# Altium schematic symbol library jlcpcb_2025_04_resistors_extended_1210.schlib: 2670 symbols (part 12 of 14) (continued)
## RS-1210K4701FT (continued)
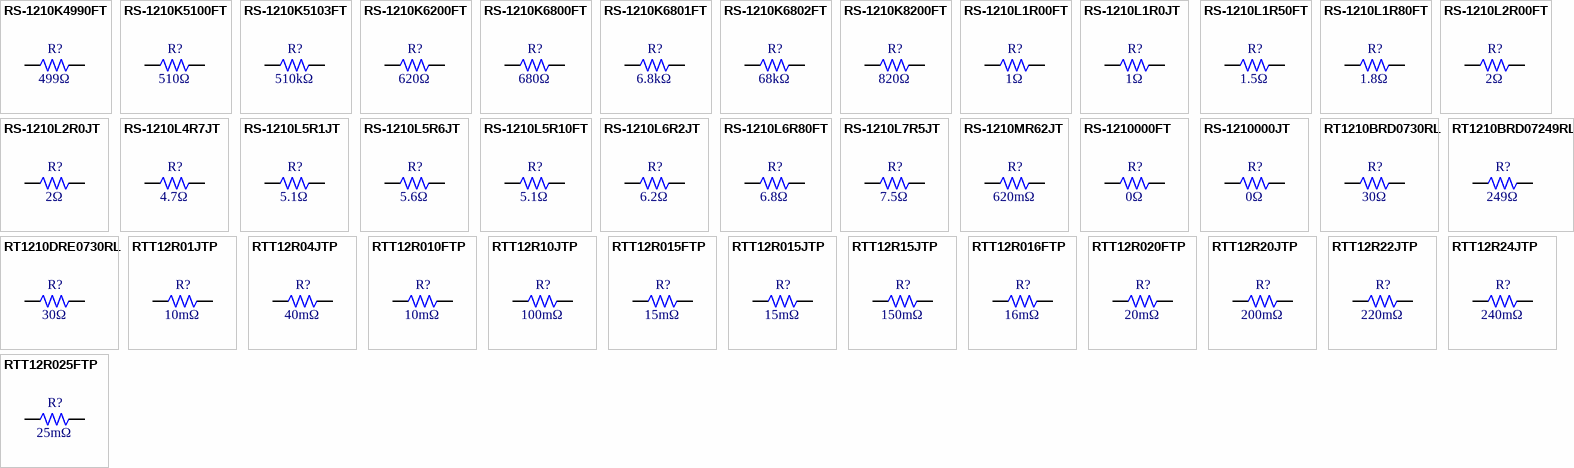
[diagram p56: symbols RS-1210K4990FT to RTT12R025FTP]

## RS-1210K4990FT
designator R?  Resistance: 499Ω  (hidden comment: *)
Resistor, 499Ω, ±1%, 333.333mW, 200V, ±100ppm/℃, -55℃~+155℃, SMD 1210; Manufacturer: Uniroyal; Manufacturer Part Number: RS-1210K4990FT; Supplier 1: LCSC; Supplier Part Number 1: C341622; JLCPCB Part Number: C341622; Power Rating: 333.333mW; Category: Resistors; Package Size: 1210; JLCPCB Basic Part: Yes; Tolerance: ±1%; Voltage Rating: 200V; Temperature Coefficient: ±100ppm/℃; Temperature Rating: -55℃~+155℃; ComponentLink1Description: Datasheet; ComponentLink1URL: https://wmsc.lcsc.com/wmsc/upload/file/pdf/v2/lcsc/2304140030_FH--Guangdong-Fenghua-Advanced-Tech-RS-1210K4990FT_C341622.pdf; ComponentLink2Description: JLCPCB Part URL; ComponentLink2URL: https://jlcpcb.com/partdetail/C341622
pins: 1, 2
1 alternate drawing of the same symbol

## RS-1210K5100FT
designator R?  Resistance: 510Ω  (hidden comment: *)
Resistor, 510Ω, ±1%, 333.333mW, 200V, ±100ppm/℃, -55℃~+155℃, SMD 1210; Manufacturer: Uniroyal; Manufacturer Part Number: RS-1210K5100FT; Supplier 1: LCSC; Supplier Part Number 1: C2991539; JLCPCB Part Number: C2991539; Power Rating: 333.333mW; Category: Resistors; Package Size: 1210; JLCPCB Basic Part: Yes; Tolerance: ±1%; Voltage Rating: 200V; Temperature Coefficient: ±100ppm/℃; Temperature Rating: -55℃~+155℃; ComponentLink1Description: Datasheet; ComponentLink1URL: https://wmsc.lcsc.com/wmsc/upload/file/pdf/v2/lcsc/2204111630_FH--Guangdong-Fenghua-Advanced-Tech-RS-1210K5100FT_C2991539.pdf; ComponentLink2Description: JLCPCB Part URL; ComponentLink2URL: https://jlcpcb.com/partdetail/C2991539
pins: 1, 2
1 alternate drawing of the same symbol

## RS-1210K5103FT
designator R?  Resistance: 510kΩ  (hidden comment: *)
Resistor, 510kΩ, ±1%, 333.333mW, ±100ppm/℃, -55℃~+155℃, SMD 1210; Manufacturer: Uniroyal; Manufacturer Part Number: RS-1210K5103FT; Supplier 1: LCSC; Supplier Part Number 1: C2939812; JLCPCB Part Number: C2939812; Power Rating: 333.333mW; Category: Resistors; Package Size: 1210; JLCPCB Basic Part: Yes; Tolerance: ±1%; Temperature Coefficient: ±100ppm/℃; Temperature Rating: -55℃~+155℃; ComponentLink1Description: Datasheet; ComponentLink1URL: https://wmsc.lcsc.com/wmsc/upload/file/pdf/v2/lcsc/2201121830_FH--Guangdong-Fenghua-Advanced-Tech-RS-1210K5103FT_C2939812.pdf; ComponentLink2Description: JLCPCB Part URL; ComponentLink2URL: https://jlcpcb.com/partdetail/C2939812
pins: 1, 2
1 alternate drawing of the same symbol

## RS-1210K6200FT
designator R?  Resistance: 620Ω  (hidden comment: *)
Resistor, 620Ω, ±1%, 333.333mW, ±100ppm/℃, -55℃~+155℃, SMD 1210; Manufacturer: Uniroyal; Manufacturer Part Number: RS-1210K6200FT; Supplier 1: LCSC; Supplier Part Number 1: C2961544; JLCPCB Part Number: C2961544; Power Rating: 333.333mW; Category: Resistors; Package Size: 1210; JLCPCB Basic Part: Yes; Tolerance: ±1%; Temperature Coefficient: ±100ppm/℃; Temperature Rating: -55℃~+155℃; ComponentLink1Description: Datasheet; ComponentLink1URL: https://wmsc.lcsc.com/wmsc/upload/file/pdf/v2/lcsc/2202211530_FH--Guangdong-Fenghua-Advanced-Tech-RS-1210K6200FT_C2961544.pdf; ComponentLink2Description: JLCPCB Part URL; ComponentLink2URL: https://jlcpcb.com/partdetail/C2961544
pins: 1, 2
1 alternate drawing of the same symbol

## RS-1210K6800FT
designator R?  Resistance: 680Ω  (hidden comment: *)
Resistor, 680Ω, ±1%, 333.333mW, 200V, ±100ppm/℃, -55℃~+155℃, SMD 1210; Manufacturer: Uniroyal; Manufacturer Part Number: RS-1210K6800FT; Supplier 1: LCSC; Supplier Part Number 1: C2991549; JLCPCB Part Number: C2991549; Power Rating: 333.333mW; Category: Resistors; Package Size: 1210; JLCPCB Basic Part: Yes; Tolerance: ±1%; Voltage Rating: 200V; Temperature Coefficient: ±100ppm/℃; Temperature Rating: -55℃~+155℃; ComponentLink1Description: Datasheet; ComponentLink1URL: https://wmsc.lcsc.com/wmsc/upload/file/pdf/v2/lcsc/2204111630_FH--Guangdong-Fenghua-Advanced-Tech-RS-1210K6800FT_C2991549.pdf; ComponentLink2Description: JLCPCB Part URL; ComponentLink2URL: https://jlcpcb.com/partdetail/C2991549
pins: 1, 2
1 alternate drawing of the same symbol

## RS-1210K6801FT
designator R?  Resistance: 6.8kΩ  (hidden comment: *)
Resistor, 6.8kΩ, ±1%, 333.333mW, 200V, ±100ppm/℃, -55℃~+155℃, SMD 1210; Manufacturer: Uniroyal; Manufacturer Part Number: RS-1210K6801FT; Supplier 1: LCSC; Supplier Part Number 1: C310374; JLCPCB Part Number: C310374; Power Rating: 333.333mW; Category: Resistors; Package Size: 1210; JLCPCB Basic Part: Yes; Tolerance: ±1%; Voltage Rating: 200V; Temperature Coefficient: ±100ppm/℃; Temperature Rating: -55℃~+155℃; ComponentLink1Description: Datasheet; ComponentLink1URL: https://wmsc.lcsc.com/wmsc/upload/file/pdf/v2/lcsc/2304140030_FH--Guangdong-Fenghua-Advanced-Tech-RS-1210K6801FT_C310374.pdf; ComponentLink2Description: JLCPCB Part URL; ComponentLink2URL: https://jlcpcb.com/partdetail/C310374
pins: 1, 2
1 alternate drawing of the same symbol

## RS-1210K6802FT
designator R?  Resistance: 68kΩ  (hidden comment: *)
Resistor, 68kΩ, ±1%, 333.333mW, ±100ppm/℃, SMD 1210; Manufacturer: Uniroyal; Manufacturer Part Number: RS-1210K6802FT; Supplier 1: LCSC; Supplier Part Number 1: C880420; JLCPCB Part Number: C880420; Power Rating: 333.333mW; Category: Resistors; Package Size: 1210; JLCPCB Basic Part: Yes; Tolerance: ±1%; Temperature Coefficient: ±100ppm/℃; ComponentLink1Description: Datasheet; ComponentLink1URL: https://wmsc.lcsc.com/wmsc/upload/file/pdf/v2/lcsc/2304140030_FH--Guangdong-Fenghua-Advanced-Tech-RS-1210K6802FT_C880420.pdf; ComponentLink2Description: JLCPCB Part URL; ComponentLink2URL: https://jlcpcb.com/partdetail/C880420
pins: 1, 2
1 alternate drawing of the same symbol

## RS-1210K8200FT
designator R?  Resistance: 820Ω  (hidden comment: *)
Resistor, 820Ω, ±1%, 333.333mW, ±100ppm/℃, SMD 1210; Manufacturer: Uniroyal; Manufacturer Part Number: RS-1210K8200FT; Supplier 1: LCSC; Supplier Part Number 1: C880401; JLCPCB Part Number: C880401; Power Rating: 333.333mW; Category: Resistors; Package Size: 1210; JLCPCB Basic Part: Yes; Tolerance: ±1%; Temperature Coefficient: ±100ppm/℃; ComponentLink1Description: Datasheet; ComponentLink1URL: https://wmsc.lcsc.com/wmsc/upload/file/pdf/v2/lcsc/2304140030_FH--Guangdong-Fenghua-Advanced-Tech-RS-1210K8200FT_C880401.pdf; ComponentLink2Description: JLCPCB Part URL; ComponentLink2URL: https://jlcpcb.com/partdetail/C880401
pins: 1, 2
1 alternate drawing of the same symbol

## RS-1210L1R00FT
designator R?  Resistance: 1Ω  (hidden comment: *)
Resistor, 1Ω, ±1%, 333.333mW, ±250ppm/℃, -55℃~+155℃, SMD 1210; Manufacturer: Uniroyal; Manufacturer Part Number: RS-1210L1R00FT; Supplier 1: LCSC; Supplier Part Number 1: C2961549; JLCPCB Part Number: C2961549; Power Rating: 333.333mW; Category: Resistors; Package Size: 1210; JLCPCB Basic Part: Yes; Tolerance: ±1%; Temperature Coefficient: ±250ppm/℃; Temperature Rating: -55℃~+155℃; ComponentLink1Description: Datasheet; ComponentLink1URL: https://wmsc.lcsc.com/wmsc/upload/file/pdf/v2/lcsc/2202211530_FH--Guangdong-Fenghua-Advanced-Tech-RS-1210L1R00FT_C2961549.pdf; ComponentLink2Description: JLCPCB Part URL; ComponentLink2URL: https://jlcpcb.com/partdetail/C2961549
pins: 1, 2
1 alternate drawing of the same symbol

## RS-1210L1R0JT
designator R?  Resistance: 1Ω  (hidden comment: *)
Resistor, 1Ω, ±5%, 333.333mW, 200V, ±250ppm/℃, -55℃~+155℃, SMD 1210; Manufacturer: Uniroyal; Manufacturer Part Number: RS-1210L1R0JT; Supplier 1: LCSC; Supplier Part Number 1: C294809; JLCPCB Part Number: C294809; Power Rating: 333.333mW; Category: Resistors; Package Size: 1210; JLCPCB Basic Part: Yes; Tolerance: ±5%; Voltage Rating: 200V; Temperature Coefficient: ±250ppm/℃; Temperature Rating: -55℃~+155℃; ComponentLink1Description: Datasheet; ComponentLink1URL: https://wmsc.lcsc.com/wmsc/upload/file/pdf/v2/lcsc/2304140030_FH--Guangdong-Fenghua-Advanced-Tech-RS-1210L1R0JT_C294809.pdf; ComponentLink2Description: JLCPCB Part URL; ComponentLink2URL: https://jlcpcb.com/partdetail/C294809
pins: 1, 2
1 alternate drawing of the same symbol

## RS-1210L1R50FT
designator R?  Resistance: 1.5Ω  (hidden comment: *)
Resistor, 1.5Ω, ±1%, 333.333mW, 200V, ±250ppm/℃, -55℃~+155℃, SMD 1210; Manufacturer: Uniroyal; Manufacturer Part Number: RS-1210L1R50FT; Supplier 1: LCSC; Supplier Part Number 1: C341614; JLCPCB Part Number: C341614; Power Rating: 333.333mW; Category: Resistors; Package Size: 1210; JLCPCB Basic Part: Yes; Tolerance: ±1%; Voltage Rating: 200V; Temperature Coefficient: ±250ppm/℃; Temperature Rating: -55℃~+155℃; ComponentLink1Description: Datasheet; ComponentLink1URL: https://wmsc.lcsc.com/wmsc/upload/file/pdf/v2/lcsc/2304140030_FH--Guangdong-Fenghua-Advanced-Tech-RS-1210L1R50FT_C341614.pdf; ComponentLink2Description: JLCPCB Part URL; ComponentLink2URL: https://jlcpcb.com/partdetail/C341614
pins: 1, 2
1 alternate drawing of the same symbol

## RS-1210L1R80FT
designator R?  Resistance: 1.8Ω  (hidden comment: *)
Resistor, 1.8Ω, ±1%, 333.333mW, 200V, ±250ppm/℃, -55℃~+155℃, SMD 1210; Manufacturer: Uniroyal; Manufacturer Part Number: RS-1210L1R80FT; Supplier 1: LCSC; Supplier Part Number 1: C341615; JLCPCB Part Number: C341615; Power Rating: 333.333mW; Category: Resistors; Package Size: 1210; JLCPCB Basic Part: Yes; Tolerance: ±1%; Voltage Rating: 200V; Temperature Coefficient: ±250ppm/℃; Temperature Rating: -55℃~+155℃; ComponentLink1Description: Datasheet; ComponentLink1URL: https://wmsc.lcsc.com/wmsc/upload/file/pdf/v2/lcsc/2304140030_FH--Guangdong-Fenghua-Advanced-Tech-RS-1210L1R80FT_C341615.pdf; ComponentLink2Description: JLCPCB Part URL; ComponentLink2URL: https://jlcpcb.com/partdetail/C341615
pins: 1, 2
1 alternate drawing of the same symbol

## RS-1210L2R00FT
designator R?  Resistance: 2Ω  (hidden comment: *)
Resistor, 2Ω, ±1%, ±250ppm/℃, SMD 1210; Manufacturer: Uniroyal; Manufacturer Part Number: RS-1210L2R00FT; Supplier 1: LCSC; Supplier Part Number 1: C3036932; JLCPCB Part Number: C3036932; Category: Resistors; Package Size: 1210; JLCPCB Basic Part: Yes; Tolerance: ±1%; Temperature Coefficient: ±250ppm/℃; ComponentLink1Description: Datasheet; ComponentLink1URL: https://wmsc.lcsc.com/wmsc/upload/file/pdf/v2/lcsc/2206291630_FH--Guangdong-Fenghua-Advanced-Tech-RS-1210L2R00FT_C3036932.pdf; ComponentLink2Description: JLCPCB Part URL; ComponentLink2URL: https://jlcpcb.com/partdetail/C3036932
pins: 1, 2
1 alternate drawing of the same symbol

## RS-1210L2R0JT
designator R?  Resistance: 2Ω  (hidden comment: *)
Resistor, 2Ω, ±5%, 333.333mW, 200V, ±250ppm/℃, -55℃~+155℃, SMD 1210; Manufacturer: Uniroyal; Manufacturer Part Number: RS-1210L2R0JT; Supplier 1: LCSC; Supplier Part Number 1: C2842075; JLCPCB Part Number: C2842075; Power Rating: 333.333mW; Category: Resistors; Package Size: 1210; JLCPCB Basic Part: Yes; Tolerance: ±5%; Voltage Rating: 200V; Temperature Coefficient: ±250ppm/℃; Temperature Rating: -55℃~+155℃; ComponentLink1Description: Datasheet; ComponentLink1URL: https://wmsc.lcsc.com/wmsc/upload/file/pdf/v2/lcsc/2108071830_FH--Guangdong-Fenghua-Advanced-Tech-RS-1210L2R0JT_C2842075.pdf; ComponentLink2Description: JLCPCB Part URL; ComponentLink2URL: https://jlcpcb.com/partdetail/C2842075
pins: 1, 2
1 alternate drawing of the same symbol

## RS-1210L4R7JT
designator R?  Resistance: 4.7Ω  (hidden comment: *)
Resistor, 4.7Ω, ±5%, 333.333mW, 200V, ±250ppm/℃, -55℃~+155℃, SMD 1210; Manufacturer: Uniroyal; Manufacturer Part Number: RS-1210L4R7JT; Supplier 1: LCSC; Supplier Part Number 1: C341623; JLCPCB Part Number: C341623; Power Rating: 333.333mW; Category: Resistors; Package Size: 1210; JLCPCB Basic Part: Yes; Tolerance: ±5%; Voltage Rating: 200V; Temperature Coefficient: ±250ppm/℃; Temperature Rating: -55℃~+155℃; ComponentLink1Description: Datasheet; ComponentLink1URL: https://wmsc.lcsc.com/wmsc/upload/file/pdf/v2/lcsc/2304140030_FH--Guangdong-Fenghua-Advanced-Tech-RS-1210L4R7JT_C341623.pdf; ComponentLink2Description: JLCPCB Part URL; ComponentLink2URL: https://jlcpcb.com/partdetail/C341623
pins: 1, 2
1 alternate drawing of the same symbol

## RS-1210L5R1JT
designator R?  Resistance: 5.1Ω  (hidden comment: *)
Resistor, 5.1Ω, ±5%, 333.333mW, 200V, ±250ppm/℃, -55℃~+155℃, SMD 1210; Manufacturer: Uniroyal; Manufacturer Part Number: RS-1210L5R1JT; Supplier 1: LCSC; Supplier Part Number 1: C341626; JLCPCB Part Number: C341626; Power Rating: 333.333mW; Category: Resistors; Package Size: 1210; JLCPCB Basic Part: Yes; Tolerance: ±5%; Voltage Rating: 200V; Temperature Coefficient: ±250ppm/℃; Temperature Rating: -55℃~+155℃; ComponentLink1Description: Datasheet; ComponentLink1URL: https://wmsc.lcsc.com/wmsc/upload/file/pdf/v2/lcsc/2304140030_FH--Guangdong-Fenghua-Advanced-Tech-RS-1210L5R1JT_C341626.pdf; ComponentLink2Description: JLCPCB Part URL; ComponentLink2URL: https://jlcpcb.com/partdetail/C341626
pins: 1, 2
1 alternate drawing of the same symbol

## RS-1210L5R6JT
designator R?  Resistance: 5.6Ω  (hidden comment: *)
Resistor, 5.6Ω, ±5%, 333.333mW, 200V, ±100ppm/℃, -55℃~+155℃, SMD 1210; Manufacturer: Uniroyal; Manufacturer Part Number: RS-1210L5R6JT; Supplier 1: LCSC; Supplier Part Number 1: C575441; JLCPCB Part Number: C575441; Power Rating: 333.333mW; Category: Resistors; Package Size: 1210; JLCPCB Basic Part: Yes; Tolerance: ±5%; Voltage Rating: 200V; Temperature Coefficient: ±100ppm/℃; Temperature Rating: -55℃~+155℃; ComponentLink1Description: Datasheet; ComponentLink1URL: https://wmsc.lcsc.com/wmsc/upload/file/pdf/v2/lcsc/2304140030_FH--Guangdong-Fenghua-Advanced-Tech-RS-1210L5R6JT_C575441.pdf; ComponentLink2Description: JLCPCB Part URL; ComponentLink2URL: https://jlcpcb.com/partdetail/C575441
pins: 1, 2
1 alternate drawing of the same symbol

## RS-1210L5R10FT
designator R?  Resistance: 5.1Ω  (hidden comment: *)
Resistor, 5.1Ω, ±1%, 333.333mW, 200V, ±250ppm/℃, -55℃~+155℃, SMD 1210; Manufacturer: Uniroyal; Manufacturer Part Number: RS-1210L5R10FT; Supplier 1: LCSC; Supplier Part Number 1: C880303; JLCPCB Part Number: C880303; Power Rating: 333.333mW; Category: Resistors; Package Size: 1210; JLCPCB Basic Part: Yes; Tolerance: ±1%; Voltage Rating: 200V; Temperature Coefficient: ±250ppm/℃; Temperature Rating: -55℃~+155℃; ComponentLink1Description: Datasheet; ComponentLink2Description: JLCPCB Part URL; ComponentLink2URL: https://jlcpcb.com/partdetail/C880303
pins: 1, 2
1 alternate drawing of the same symbol

## RS-1210L6R2JT
designator R?  Resistance: 6.2Ω  (hidden comment: *)
Resistor, 6.2Ω, ±5%, 333.333mW, 200V, ±250ppm/℃, -55℃~+155℃, SMD 1210; Manufacturer: Uniroyal; Manufacturer Part Number: RS-1210L6R2JT; Supplier 1: LCSC; Supplier Part Number 1: C341627; JLCPCB Part Number: C341627; Power Rating: 333.333mW; Category: Resistors; Package Size: 1210; JLCPCB Basic Part: Yes; Tolerance: ±5%; Voltage Rating: 200V; Temperature Coefficient: ±250ppm/℃; Temperature Rating: -55℃~+155℃; ComponentLink1Description: Datasheet; ComponentLink1URL: https://wmsc.lcsc.com/wmsc/upload/file/pdf/v2/lcsc/2304140030_FH--Guangdong-Fenghua-Advanced-Tech-RS-1210L6R2JT_C341627.pdf; ComponentLink2Description: JLCPCB Part URL; ComponentLink2URL: https://jlcpcb.com/partdetail/C341627
pins: 1, 2
1 alternate drawing of the same symbol

## RS-1210L6R80FT
designator R?  Resistance: 6.8Ω  (hidden comment: *)
Resistor, 6.8Ω, ±1%, 333.333mW, 200V, ±250ppm/℃, -55℃~+155℃, SMD 1210; Manufacturer: Uniroyal; Manufacturer Part Number: RS-1210L6R80FT; Supplier 1: LCSC; Supplier Part Number 1: C341628; JLCPCB Part Number: C341628; Power Rating: 333.333mW; Category: Resistors; Package Size: 1210; JLCPCB Basic Part: Yes; Tolerance: ±1%; Voltage Rating: 200V; Temperature Coefficient: ±250ppm/℃; Temperature Rating: -55℃~+155℃; ComponentLink1Description: Datasheet; ComponentLink1URL: https://wmsc.lcsc.com/wmsc/upload/file/pdf/v2/lcsc/2304140030_FH--Guangdong-Fenghua-Advanced-Tech-RS-1210L6R80FT_C341628.pdf; ComponentLink2Description: JLCPCB Part URL; ComponentLink2URL: https://jlcpcb.com/partdetail/C341628
pins: 1, 2
1 alternate drawing of the same symbol

## RS-1210L7R5JT
designator R?  Resistance: 7.5Ω  (hidden comment: *)
Resistor, 7.5Ω, ±5%, 333.333mW, ±250ppm/℃, -55℃~+155℃, SMD 1210; Manufacturer: Uniroyal; Manufacturer Part Number: RS-1210L7R5JT; Supplier 1: LCSC; Supplier Part Number 1: C2961550; JLCPCB Part Number: C2961550; Power Rating: 333.333mW; Category: Resistors; Package Size: 1210; JLCPCB Basic Part: Yes; Tolerance: ±5%; Temperature Coefficient: ±250ppm/℃; Temperature Rating: -55℃~+155℃; ComponentLink1Description: Datasheet; ComponentLink1URL: https://wmsc.lcsc.com/wmsc/upload/file/pdf/v2/lcsc/2202211530_FH--Guangdong-Fenghua-Advanced-Tech-RS-1210L7R5JT_C2961550.pdf; ComponentLink2Description: JLCPCB Part URL; ComponentLink2URL: https://jlcpcb.com/partdetail/C2961550
pins: 1, 2
1 alternate drawing of the same symbol

## RS-1210MR62JT
designator R?  Resistance: 620mΩ  (hidden comment: *)
Resistor, 620mΩ, ±5%, 333.333mW, 200V, -55℃~+155℃, SMD 1210; Manufacturer: Uniroyal; Manufacturer Part Number: RS-1210MR62JT; Supplier 1: LCSC; Supplier Part Number 1: C341604; JLCPCB Part Number: C341604; Power Rating: 333.333mW; Category: Resistors; Package Size: 1210; JLCPCB Basic Part: Yes; Tolerance: ±5%; Voltage Rating: 200V; Temperature Rating: -55℃~+155℃; ComponentLink1Description: Datasheet; ComponentLink1URL: https://wmsc.lcsc.com/wmsc/upload/file/pdf/v2/lcsc/2304140030_FH--Guangdong-Fenghua-Advanced-Tech-RS-1210MR62JT_C341604.pdf; ComponentLink2Description: JLCPCB Part URL; ComponentLink2URL: https://jlcpcb.com/partdetail/C341604
pins: 1, 2
1 alternate drawing of the same symbol

## RS-1210000FT
designator R?  Resistance: 0Ω  (hidden comment: *)
Resistor, 0Ω, ±1%, 333.333mW, 200V, -55℃~+155℃, SMD 1210; Manufacturer: Uniroyal; Manufacturer Part Number: RS-1210000FT; Supplier 1: LCSC; Supplier Part Number 1: C341603; JLCPCB Part Number: C341603; Power Rating: 333.333mW; Category: Resistors; Package Size: 1210; JLCPCB Basic Part: Yes; Tolerance: ±1%; Voltage Rating: 200V; Temperature Rating: -55℃~+155℃; ComponentLink1Description: Datasheet; ComponentLink1URL: https://wmsc.lcsc.com/wmsc/upload/file/pdf/v2/lcsc/2304140030_FH--Guangdong-Fenghua-Advanced-Tech-RS-1210000FT_C341603.pdf; ComponentLink2Description: JLCPCB Part URL; ComponentLink2URL: https://jlcpcb.com/partdetail/C341603
pins: 1, 2
1 alternate drawing of the same symbol

## RS-1210000JT
designator R?  Resistance: 0Ω  (hidden comment: *)
Resistor, 0Ω, ±5%, 333.333mW, 200V, -55℃~+155℃, SMD 1210; Manufacturer: Uniroyal; Manufacturer Part Number: RS-1210000JT; Supplier 1: LCSC; Supplier Part Number 1: C140000; JLCPCB Part Number: C140000; Power Rating: 333.333mW; Category: Resistors; Package Size: 1210; JLCPCB Basic Part: Yes; Tolerance: ±5%; Voltage Rating: 200V; Temperature Rating: -55℃~+155℃; ComponentLink1Description: Datasheet; ComponentLink1URL: https://wmsc.lcsc.com/wmsc/upload/file/pdf/v2/lcsc/2304140030_FH--Guangdong-Fenghua-Advanced-Tech-RS-1210000JT_C140000.pdf; ComponentLink2Description: JLCPCB Part URL; ComponentLink2URL: https://jlcpcb.com/partdetail/C140000
pins: 1, 2
1 alternate drawing of the same symbol

## RT1210BRD0730RL
designator R?  Resistance: 30Ω  (hidden comment: *)
Resistor, 30Ω, ±0.1%, 250mW, 200V, ±25ppm/℃, -55℃~+125℃, SMD 1210; Manufacturer: Uniroyal; Manufacturer Part Number: RT1210BRD0730RL; Supplier 1: LCSC; Supplier Part Number 1: C706456; JLCPCB Part Number: C706456; Power Rating: 250mW; Category: Resistors; Package Size: 1210; JLCPCB Basic Part: Yes; Tolerance: ±0.1%; Voltage Rating: 200V; Temperature Coefficient: ±25ppm/℃; Temperature Rating: -55℃~+125℃; ComponentLink1Description: Datasheet; ComponentLink1URL: https://wmsc.lcsc.com/wmsc/upload/file/pdf/v2/lcsc/2010201906_YAGEO-RT1210BRD0730RL_C706456.pdf; ComponentLink2Description: JLCPCB Part URL; ComponentLink2URL: https://jlcpcb.com/partdetail/C706456
pins: 1, 2
1 alternate drawing of the same symbol

## RT1210BRD07249RL
designator R?  Resistance: 249Ω  (hidden comment: *)
Resistor, 249Ω, ±0.1%, 250mW, 200V, ±25ppm/℃, -55℃~+125℃, SMD 1210; Manufacturer: Uniroyal; Manufacturer Part Number: RT1210BRD07249RL; Supplier 1: LCSC; Supplier Part Number 1: C723700; JLCPCB Part Number: C723700; Power Rating: 250mW; Category: Resistors; Package Size: 1210; JLCPCB Basic Part: Yes; Tolerance: ±0.1%; Voltage Rating: 200V; Temperature Coefficient: ±25ppm/℃; Temperature Rating: -55℃~+125℃; ComponentLink1Description: Datasheet; ComponentLink1URL: https://wmsc.lcsc.com/wmsc/upload/file/pdf/v2/lcsc/2008171337_YAGEO-RT1210BRD07249RL_C723700.pdf; ComponentLink2Description: JLCPCB Part URL; ComponentLink2URL: https://jlcpcb.com/partdetail/C723700
pins: 1, 2
1 alternate drawing of the same symbol

## RT1210DRE0730RL
designator R?  Resistance: 30Ω  (hidden comment: *)
Resistor, 30Ω, ±0.5%, 250mW, 200V, ±50ppm/℃, -55℃~+125℃, SMD 1210; Manufacturer: Uniroyal; Manufacturer Part Number: RT1210DRE0730RL; Supplier 1: LCSC; Supplier Part Number 1: C706457; JLCPCB Part Number: C706457; Power Rating: 250mW; Category: Resistors; Package Size: 1210; JLCPCB Basic Part: Yes; Tolerance: ±0.5%; Voltage Rating: 200V; Temperature Coefficient: ±50ppm/℃; Temperature Rating: -55℃~+125℃; ComponentLink1Description: Datasheet; ComponentLink1URL: https://wmsc.lcsc.com/wmsc/upload/file/pdf/v2/lcsc/2010201906_YAGEO-RT1210DRE0730RL_C706457.pdf; ComponentLink2Description: JLCPCB Part URL; ComponentLink2URL: https://jlcpcb.com/partdetail/C706457
pins: 1, 2
1 alternate drawing of the same symbol

## RTT12R01JTP
designator R?  Resistance: 10mΩ  (hidden comment: *)
Resistor, 10mΩ, ±5%, 500mW, 200V, ±1500ppm/℃, -55℃~+155℃, SMD 1210; Manufacturer: Uniroyal; Manufacturer Part Number: RTT12R01JTP; Supplier 1: LCSC; Supplier Part Number 1: C159308; JLCPCB Part Number: C159308; Power Rating: 500mW; Category: Resistors; Package Size: 1210; JLCPCB Basic Part: Yes; Tolerance: ±5%; Voltage Rating: 200V; Temperature Coefficient: ±1500ppm/℃; Temperature Rating: -55℃~+155℃; ComponentLink1Description: Datasheet; ComponentLink1URL: https://wmsc.lcsc.com/wmsc/upload/file/pdf/v2/lcsc/2304140030_RALEC-RTT12R01JTP_C159308.pdf; ComponentLink2Description: JLCPCB Part URL; ComponentLink2URL: https://jlcpcb.com/partdetail/C159308
pins: 1, 2
1 alternate drawing of the same symbol

## RTT12R04JTP
designator R?  Resistance: 40mΩ  (hidden comment: *)
Resistor, 40mΩ, ±5%, 500mW, 200V, ±700ppm/℃, -55℃~+155℃, SMD 1210; Manufacturer: Uniroyal; Manufacturer Part Number: RTT12R04JTP; Supplier 1: LCSC; Supplier Part Number 1: C159303; JLCPCB Part Number: C159303; Power Rating: 500mW; Category: Resistors; Package Size: 1210; JLCPCB Basic Part: Yes; Tolerance: ±5%; Voltage Rating: 200V; Temperature Coefficient: ±700ppm/℃; Temperature Rating: -55℃~+155℃; ComponentLink1Description: Datasheet; ComponentLink1URL: https://wmsc.lcsc.com/wmsc/upload/file/pdf/v2/lcsc/2304140030_RALEC-RTT12R04JTP_C159303.pdf; ComponentLink2Description: JLCPCB Part URL; ComponentLink2URL: https://jlcpcb.com/partdetail/C159303
pins: 1, 2
1 alternate drawing of the same symbol

## RTT12R010FTP
designator R?  Resistance: 10mΩ  (hidden comment: *)
Resistor, 10mΩ, ±1%, 500mW, 200V, ±1500ppm/℃, -55℃~+155℃, SMD 1210; Manufacturer: Uniroyal; Manufacturer Part Number: RTT12R010FTP; Supplier 1: LCSC; Supplier Part Number 1: C159310; JLCPCB Part Number: C159310; Power Rating: 500mW; Category: Resistors; Package Size: 1210; JLCPCB Basic Part: Yes; Tolerance: ±1%; Voltage Rating: 200V; Temperature Coefficient: ±1500ppm/℃; Temperature Rating: -55℃~+155℃; ComponentLink1Description: Datasheet; ComponentLink1URL: https://wmsc.lcsc.com/wmsc/upload/file/pdf/v2/lcsc/2304140030_RALEC-RTT12R010FTP_C159310.pdf; ComponentLink2Description: JLCPCB Part URL; ComponentLink2URL: https://jlcpcb.com/partdetail/C159310
pins: 1, 2
1 alternate drawing of the same symbol

## RTT12R10JTP
designator R?  Resistance: 100mΩ  (hidden comment: *)
Resistor, 100mΩ, ±5%, 500mW, 200V, ±200ppm/℃, -55℃~+155℃, SMD 1210; Manufacturer: Uniroyal; Manufacturer Part Number: RTT12R10JTP; Supplier 1: LCSC; Supplier Part Number 1: C105051; JLCPCB Part Number: C105051; Power Rating: 500mW; Category: Resistors; Package Size: 1210; JLCPCB Basic Part: Yes; Tolerance: ±5%; Voltage Rating: 200V; Temperature Coefficient: ±200ppm/℃; Temperature Rating: -55℃~+155℃; ComponentLink1Description: Datasheet; ComponentLink1URL: https://wmsc.lcsc.com/wmsc/upload/file/pdf/v2/lcsc/2304140030_RALEC-RTT12R10JTP_C105051.pdf; ComponentLink2Description: JLCPCB Part URL; ComponentLink2URL: https://jlcpcb.com/partdetail/C105051
pins: 1, 2
1 alternate drawing of the same symbol

## RTT12R015FTP
designator R?  Resistance: 15mΩ  (hidden comment: *)
Resistor, 15mΩ, ±1%, 500mW, 200V, ±1500ppm/℃, -55℃~+155℃, SMD 1210; Manufacturer: Uniroyal; Manufacturer Part Number: RTT12R015FTP; Supplier 1: LCSC; Supplier Part Number 1: C305061; JLCPCB Part Number: C305061; Power Rating: 500mW; Category: Resistors; Package Size: 1210; JLCPCB Basic Part: Yes; Tolerance: ±1%; Voltage Rating: 200V; Temperature Coefficient: ±1500ppm/℃; Temperature Rating: -55℃~+155℃; ComponentLink1Description: Datasheet; ComponentLink1URL: https://wmsc.lcsc.com/wmsc/upload/file/pdf/v2/lcsc/2304140030_RALEC-RTT12R015FTP_C305061.pdf; ComponentLink2Description: JLCPCB Part URL; ComponentLink2URL: https://jlcpcb.com/partdetail/C305061
pins: 1, 2
1 alternate drawing of the same symbol

## RTT12R015JTP
designator R?  Resistance: 15mΩ  (hidden comment: *)
Resistor, 15mΩ, ±5%, 500mW, 200V, ±1500ppm/℃, -55℃~+155℃, SMD 1210; Manufacturer: Uniroyal; Manufacturer Part Number: RTT12R015JTP; Supplier 1: LCSC; Supplier Part Number 1: C159309; JLCPCB Part Number: C159309; Power Rating: 500mW; Category: Resistors; Package Size: 1210; JLCPCB Basic Part: Yes; Tolerance: ±5%; Voltage Rating: 200V; Temperature Coefficient: ±1500ppm/℃; Temperature Rating: -55℃~+155℃; ComponentLink1Description: Datasheet; ComponentLink1URL: https://wmsc.lcsc.com/wmsc/upload/file/pdf/v2/lcsc/2304140030_RALEC-RTT12R015JTP_C159309.pdf; ComponentLink2Description: JLCPCB Part URL; ComponentLink2URL: https://jlcpcb.com/partdetail/C159309
pins: 1, 2
1 alternate drawing of the same symbol

## RTT12R15JTP
designator R?  Resistance: 150mΩ  (hidden comment: *)
Resistor, 150mΩ, ±5%, 500mW, 200V, ±200ppm/℃, -55℃~+155℃, SMD 1210; Manufacturer: Uniroyal; Manufacturer Part Number: RTT12R15JTP; Supplier 1: LCSC; Supplier Part Number 1: C159297; JLCPCB Part Number: C159297; Power Rating: 500mW; Category: Resistors; Package Size: 1210; JLCPCB Basic Part: Yes; Tolerance: ±5%; Voltage Rating: 200V; Temperature Coefficient: ±200ppm/℃; Temperature Rating: -55℃~+155℃; ComponentLink1Description: Datasheet; ComponentLink1URL: https://wmsc.lcsc.com/wmsc/upload/file/pdf/v2/lcsc/2304140030_RALEC-RTT12R15JTP_C159297.pdf; ComponentLink2Description: JLCPCB Part URL; ComponentLink2URL: https://jlcpcb.com/partdetail/C159297
pins: 1, 2
1 alternate drawing of the same symbol

## RTT12R016FTP
designator R?  Resistance: 16mΩ  (hidden comment: *)
Resistor, 16mΩ, ±1%, 500mW, 200V, ±1500ppm/℃, -55℃~+155℃, SMD 1210; Manufacturer: Uniroyal; Manufacturer Part Number: RTT12R016FTP; Supplier 1: LCSC; Supplier Part Number 1: C333244; JLCPCB Part Number: C333244; Power Rating: 500mW; Category: Resistors; Package Size: 1210; JLCPCB Basic Part: Yes; Tolerance: ±1%; Voltage Rating: 200V; Temperature Coefficient: ±1500ppm/℃; Temperature Rating: -55℃~+155℃; ComponentLink1Description: Datasheet; ComponentLink1URL: https://wmsc.lcsc.com/wmsc/upload/file/pdf/v2/lcsc/2304140030_RALEC-RTT12R016FTP_C333244.pdf; ComponentLink2Description: JLCPCB Part URL; ComponentLink2URL: https://jlcpcb.com/partdetail/C333244
pins: 1, 2
1 alternate drawing of the same symbol

## RTT12R020FTP
designator R?  Resistance: 20mΩ  (hidden comment: *)
Resistor, 20mΩ, ±1%, 500mW, 200V, ±1000ppm/℃, -55℃~+155℃, SMD 1210; Manufacturer: Uniroyal; Manufacturer Part Number: RTT12R020FTP; Supplier 1: LCSC; Supplier Part Number 1: C159307; JLCPCB Part Number: C159307; Power Rating: 500mW; Category: Resistors; Package Size: 1210; JLCPCB Basic Part: Yes; Tolerance: ±1%; Voltage Rating: 200V; Temperature Coefficient: ±1000ppm/℃; Temperature Rating: -55℃~+155℃; ComponentLink1Description: Datasheet; ComponentLink1URL: https://wmsc.lcsc.com/wmsc/upload/file/pdf/v2/lcsc/2304140030_RALEC-RTT12R020FTP_C159307.pdf; ComponentLink2Description: JLCPCB Part URL; ComponentLink2URL: https://jlcpcb.com/partdetail/C159307
pins: 1, 2
1 alternate drawing of the same symbol

## RTT12R20JTP
designator R?  Resistance: 200mΩ  (hidden comment: *)
Resistor, 200mΩ, ±5%, 500mW, 200V, ±200ppm/℃, -55℃~+155℃, SMD 1210; Manufacturer: Uniroyal; Manufacturer Part Number: RTT12R20JTP; Supplier 1: LCSC; Supplier Part Number 1: C159295; JLCPCB Part Number: C159295; Power Rating: 500mW; Category: Resistors; Package Size: 1210; JLCPCB Basic Part: Yes; Tolerance: ±5%; Voltage Rating: 200V; Temperature Coefficient: ±200ppm/℃; Temperature Rating: -55℃~+155℃; ComponentLink1Description: Datasheet; ComponentLink1URL: https://wmsc.lcsc.com/wmsc/upload/file/pdf/v2/lcsc/2304140030_RALEC-RTT12R20JTP_C159295.pdf; ComponentLink2Description: JLCPCB Part URL; ComponentLink2URL: https://jlcpcb.com/partdetail/C159295
pins: 1, 2
1 alternate drawing of the same symbol

## RTT12R22JTP
designator R?  Resistance: 220mΩ  (hidden comment: *)
Resistor, 220mΩ, ±5%, 500mW, 200V, ±200ppm/℃, -55℃~+155℃, SMD 1210; Manufacturer: Uniroyal; Manufacturer Part Number: RTT12R22JTP; Supplier 1: LCSC; Supplier Part Number 1: C159293; JLCPCB Part Number: C159293; Power Rating: 500mW; Category: Resistors; Package Size: 1210; JLCPCB Basic Part: Yes; Tolerance: ±5%; Voltage Rating: 200V; Temperature Coefficient: ±200ppm/℃; Temperature Rating: -55℃~+155℃; ComponentLink1Description: Datasheet; ComponentLink1URL: https://wmsc.lcsc.com/wmsc/upload/file/pdf/v2/lcsc/2304140030_RALEC-RTT12R22JTP_C159293.pdf; ComponentLink2Description: JLCPCB Part URL; ComponentLink2URL: https://jlcpcb.com/partdetail/C159293
pins: 1, 2
1 alternate drawing of the same symbol

## RTT12R24JTP
designator R?  Resistance: 240mΩ  (hidden comment: *)
Resistor, 240mΩ, ±5%, 500mW, 200V, ±200ppm/℃, -55℃~+155℃, SMD 1210; Manufacturer: Uniroyal; Manufacturer Part Number: RTT12R24JTP; Supplier 1: LCSC; Supplier Part Number 1: C159291; JLCPCB Part Number: C159291; Power Rating: 500mW; Category: Resistors; Package Size: 1210; JLCPCB Basic Part: Yes; Tolerance: ±5%; Voltage Rating: 200V; Temperature Coefficient: ±200ppm/℃; Temperature Rating: -55℃~+155℃; ComponentLink1Description: Datasheet; ComponentLink1URL: https://wmsc.lcsc.com/wmsc/upload/file/pdf/v2/lcsc/2304140030_RALEC-RTT12R24JTP_C159291.pdf; ComponentLink2Description: JLCPCB Part URL; ComponentLink2URL: https://jlcpcb.com/partdetail/C159291
pins: 1, 2
1 alternate drawing of the same symbol

## RTT12R025FTP
designator R?  Resistance: 25mΩ  (hidden comment: *)
Resistor, 25mΩ, ±1%, 500mW, 200V, ±700ppm/℃, -55℃~+155℃, SMD 1210; Manufacturer: Uniroyal; Manufacturer Part Number: RTT12R025FTP; Supplier 1: LCSC; Supplier Part Number 1: C159306; JLCPCB Part Number: C159306; Power Rating: 500mW; Category: Resistors; Package Size: 1210; JLCPCB Basic Part: Yes; Tolerance: ±1%; Voltage Rating: 200V; Temperature Coefficient: ±700ppm/℃; Temperature Rating: -55℃~+155℃; ComponentLink1Description: Datasheet; ComponentLink1URL: https://wmsc.lcsc.com/wmsc/upload/file/pdf/v2/lcsc/2304140030_RALEC-RTT12R025FTP_C159306.pdf; ComponentLink2Description: JLCPCB Part URL; ComponentLink2URL: https://jlcpcb.com/partdetail/C159306
pins: 1, 2
1 alternate drawing of the same symbol

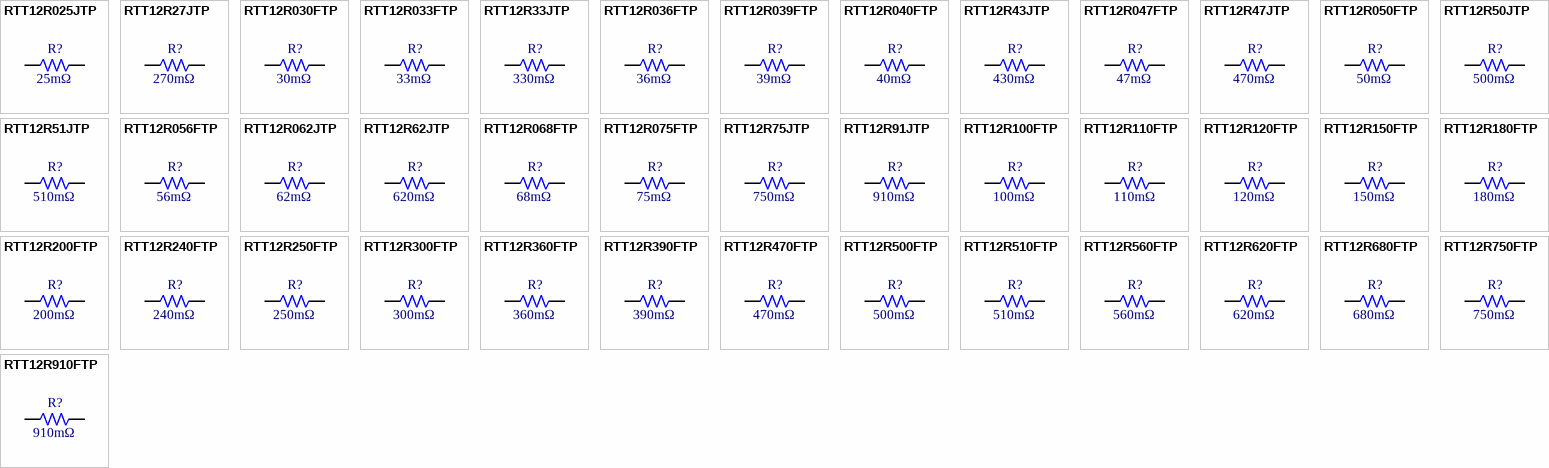
[diagram p57: symbols RTT12R025JTP to RTT12R910FTP]

## RTT12R025JTP
designator R?  Resistance: 25mΩ  (hidden comment: *)
Resistor, 25mΩ, ±5%, 500mW, SMD 1210; Manufacturer: Uniroyal; Manufacturer Part Number: RTT12R025JTP; Supplier 1: LCSC; Supplier Part Number 1: C333245; JLCPCB Part Number: C333245; Power Rating: 500mW; Category: Resistors; Package Size: 1210; JLCPCB Basic Part: Yes; Tolerance: ±5%; ComponentLink1Description: Datasheet; ComponentLink1URL: https://wmsc.lcsc.com/wmsc/upload/file/pdf/v2/lcsc/2306071603_RALEC-RTT12R025JTP_C333245.pdf; ComponentLink2Description: JLCPCB Part URL; ComponentLink2URL: https://jlcpcb.com/partdetail/C333245
pins: 1, 2
1 alternate drawing of the same symbol

## RTT12R27JTP
designator R?  Resistance: 270mΩ  (hidden comment: *)
Resistor, 270mΩ, ±5%, 500mW, 200V, ±200ppm/℃, -55℃~+155℃, SMD 1210; Manufacturer: Uniroyal; Manufacturer Part Number: RTT12R27JTP; Supplier 1: LCSC; Supplier Part Number 1: C159288; JLCPCB Part Number: C159288; Power Rating: 500mW; Category: Resistors; Package Size: 1210; JLCPCB Basic Part: Yes; Tolerance: ±5%; Voltage Rating: 200V; Temperature Coefficient: ±200ppm/℃; Temperature Rating: -55℃~+155℃; ComponentLink1Description: Datasheet; ComponentLink1URL: https://wmsc.lcsc.com/wmsc/upload/file/pdf/v2/lcsc/2304140030_RALEC-RTT12R27JTP_C159288.pdf; ComponentLink2Description: JLCPCB Part URL; ComponentLink2URL: https://jlcpcb.com/partdetail/C159288
pins: 1, 2
1 alternate drawing of the same symbol

## RTT12R030FTP
designator R?  Resistance: 30mΩ  (hidden comment: *)
Resistor, 30mΩ, ±1%, 500mW, 200V, ±700ppm/℃, -55℃~+155℃, SMD 1210; Manufacturer: Uniroyal; Manufacturer Part Number: RTT12R030FTP; Supplier 1: LCSC; Supplier Part Number 1: C333247; JLCPCB Part Number: C333247; Power Rating: 500mW; Category: Resistors; Package Size: 1210; JLCPCB Basic Part: Yes; Tolerance: ±1%; Voltage Rating: 200V; Temperature Coefficient: ±700ppm/℃; Temperature Rating: -55℃~+155℃; ComponentLink1Description: Datasheet; ComponentLink1URL: https://wmsc.lcsc.com/wmsc/upload/file/pdf/v2/lcsc/2304140030_RALEC-RTT12R030FTP_C333247.pdf; ComponentLink2Description: JLCPCB Part URL; ComponentLink2URL: https://jlcpcb.com/partdetail/C333247
pins: 1, 2
1 alternate drawing of the same symbol

## RTT12R033FTP
designator R?  Resistance: 33mΩ  (hidden comment: *)
Resistor, 33mΩ, ±1%, 500mW, 200V, ±700ppm/℃, -55℃~+155℃, SMD 1210; Manufacturer: Uniroyal; Manufacturer Part Number: RTT12R033FTP; Supplier 1: LCSC; Supplier Part Number 1: C159305; JLCPCB Part Number: C159305; Power Rating: 500mW; Category: Resistors; Package Size: 1210; JLCPCB Basic Part: Yes; Tolerance: ±1%; Voltage Rating: 200V; Temperature Coefficient: ±700ppm/℃; Temperature Rating: -55℃~+155℃; ComponentLink1Description: Datasheet; ComponentLink1URL: https://wmsc.lcsc.com/wmsc/upload/file/pdf/v2/lcsc/2304140030_RALEC-RTT12R033FTP_C159305.pdf; ComponentLink2Description: JLCPCB Part URL; ComponentLink2URL: https://jlcpcb.com/partdetail/C159305
pins: 1, 2
1 alternate drawing of the same symbol

## RTT12R33JTP
designator R?  Resistance: 330mΩ  (hidden comment: *)
Resistor, 330mΩ, ±5%, 500mW, 200V, ±200ppm/℃, -55℃~+155℃, SMD 1210; Manufacturer: Uniroyal; Manufacturer Part Number: RTT12R33JTP; Supplier 1: LCSC; Supplier Part Number 1: C333266; JLCPCB Part Number: C333266; Power Rating: 500mW; Category: Resistors; Package Size: 1210; JLCPCB Basic Part: Yes; Tolerance: ±5%; Voltage Rating: 200V; Temperature Coefficient: ±200ppm/℃; Temperature Rating: -55℃~+155℃; ComponentLink1Description: Datasheet; ComponentLink1URL: https://wmsc.lcsc.com/wmsc/upload/file/pdf/v2/lcsc/2204121100_RALEC-RTT12R33JTP_C333266.pdf; ComponentLink2Description: JLCPCB Part URL; ComponentLink2URL: https://jlcpcb.com/partdetail/C333266
pins: 1, 2
1 alternate drawing of the same symbol

## RTT12R036FTP
designator R?  Resistance: 36mΩ  (hidden comment: *)
Resistor, 36mΩ, ±1%, 500mW, ±700ppm/℃, SMD 1210; Manufacturer: Uniroyal; Manufacturer Part Number: RTT12R036FTP; Supplier 1: LCSC; Supplier Part Number 1: C333248; JLCPCB Part Number: C333248; Power Rating: 500mW; Category: Resistors; Package Size: 1210; JLCPCB Basic Part: Yes; Tolerance: ±1%; Temperature Coefficient: ±700ppm/℃; ComponentLink1Description: Datasheet; ComponentLink1URL: https://wmsc.lcsc.com/wmsc/upload/file/pdf/v2/lcsc/2304140030_RALEC-RTT12R036FTP_C333248.pdf; ComponentLink2Description: JLCPCB Part URL; ComponentLink2URL: https://jlcpcb.com/partdetail/C333248
pins: 1, 2
1 alternate drawing of the same symbol

## RTT12R039FTP
designator R?  Resistance: 39mΩ  (hidden comment: *)
Resistor, 39mΩ, ±1%, 500mW, 200V, ±700ppm/℃, -55℃~+155℃, SMD 1210; Manufacturer: Uniroyal; Manufacturer Part Number: RTT12R039FTP; Supplier 1: LCSC; Supplier Part Number 1: C333249; JLCPCB Part Number: C333249; Power Rating: 500mW; Category: Resistors; Package Size: 1210; JLCPCB Basic Part: Yes; Tolerance: ±1%; Voltage Rating: 200V; Temperature Coefficient: ±700ppm/℃; Temperature Rating: -55℃~+155℃; ComponentLink1Description: Datasheet; ComponentLink1URL: https://wmsc.lcsc.com/wmsc/upload/file/pdf/v2/lcsc/2304140030_RALEC-RTT12R039FTP_C333249.pdf; ComponentLink2Description: JLCPCB Part URL; ComponentLink2URL: https://jlcpcb.com/partdetail/C333249
pins: 1, 2
1 alternate drawing of the same symbol

## RTT12R040FTP
designator R?  Resistance: 40mΩ  (hidden comment: *)
Resistor, 40mΩ, ±1%, 500mW, 200V, ±700ppm/℃, -55℃~+155℃, SMD 1210; Manufacturer: Uniroyal; Manufacturer Part Number: RTT12R040FTP; Supplier 1: LCSC; Supplier Part Number 1: C159304; JLCPCB Part Number: C159304; Power Rating: 500mW; Category: Resistors; Package Size: 1210; JLCPCB Basic Part: Yes; Tolerance: ±1%; Voltage Rating: 200V; Temperature Coefficient: ±700ppm/℃; Temperature Rating: -55℃~+155℃; ComponentLink1Description: Datasheet; ComponentLink1URL: https://wmsc.lcsc.com/wmsc/upload/file/pdf/v2/lcsc/2304140030_RALEC-RTT12R040FTP_C159304.pdf; ComponentLink2Description: JLCPCB Part URL; ComponentLink2URL: https://jlcpcb.com/partdetail/C159304
pins: 1, 2
1 alternate drawing of the same symbol

## RTT12R43JTP
designator R?  Resistance: 430mΩ  (hidden comment: *)
Resistor, 430mΩ, ±5%, 500mW, 200V, ±200ppm/℃, -55℃~+155℃, SMD 1210; Manufacturer: Uniroyal; Manufacturer Part Number: RTT12R43JTP; Supplier 1: LCSC; Supplier Part Number 1: C159282; JLCPCB Part Number: C159282; Power Rating: 500mW; Category: Resistors; Package Size: 1210; JLCPCB Basic Part: Yes; Tolerance: ±5%; Voltage Rating: 200V; Temperature Coefficient: ±200ppm/℃; Temperature Rating: -55℃~+155℃; ComponentLink1Description: Datasheet; ComponentLink1URL: https://wmsc.lcsc.com/wmsc/upload/file/pdf/v2/lcsc/2304140030_RALEC-RTT12R43JTP_C159282.pdf; ComponentLink2Description: JLCPCB Part URL; ComponentLink2URL: https://jlcpcb.com/partdetail/C159282
pins: 1, 2
1 alternate drawing of the same symbol

## RTT12R047FTP
designator R?  Resistance: 47mΩ  (hidden comment: *)
Resistor, 47mΩ, ±1%, 500mW, 200V, ±700ppm/℃, -55℃~+155℃, SMD 1210; Manufacturer: Uniroyal; Manufacturer Part Number: RTT12R047FTP; Supplier 1: LCSC; Supplier Part Number 1: C333252; JLCPCB Part Number: C333252; Power Rating: 500mW; Category: Resistors; Package Size: 1210; JLCPCB Basic Part: Yes; Tolerance: ±1%; Voltage Rating: 200V; Temperature Coefficient: ±700ppm/℃; Temperature Rating: -55℃~+155℃; ComponentLink1Description: Datasheet; ComponentLink1URL: https://wmsc.lcsc.com/wmsc/upload/file/pdf/v2/lcsc/2304140030_RALEC-RTT12R047FTP_C333252.pdf; ComponentLink2Description: JLCPCB Part URL; ComponentLink2URL: https://jlcpcb.com/partdetail/C333252
pins: 1, 2
1 alternate drawing of the same symbol
